# Altium schematic symbol library relay.SCHLIB: 425 symbols (part 2 of 3) (continued)
## RP51* (continued)
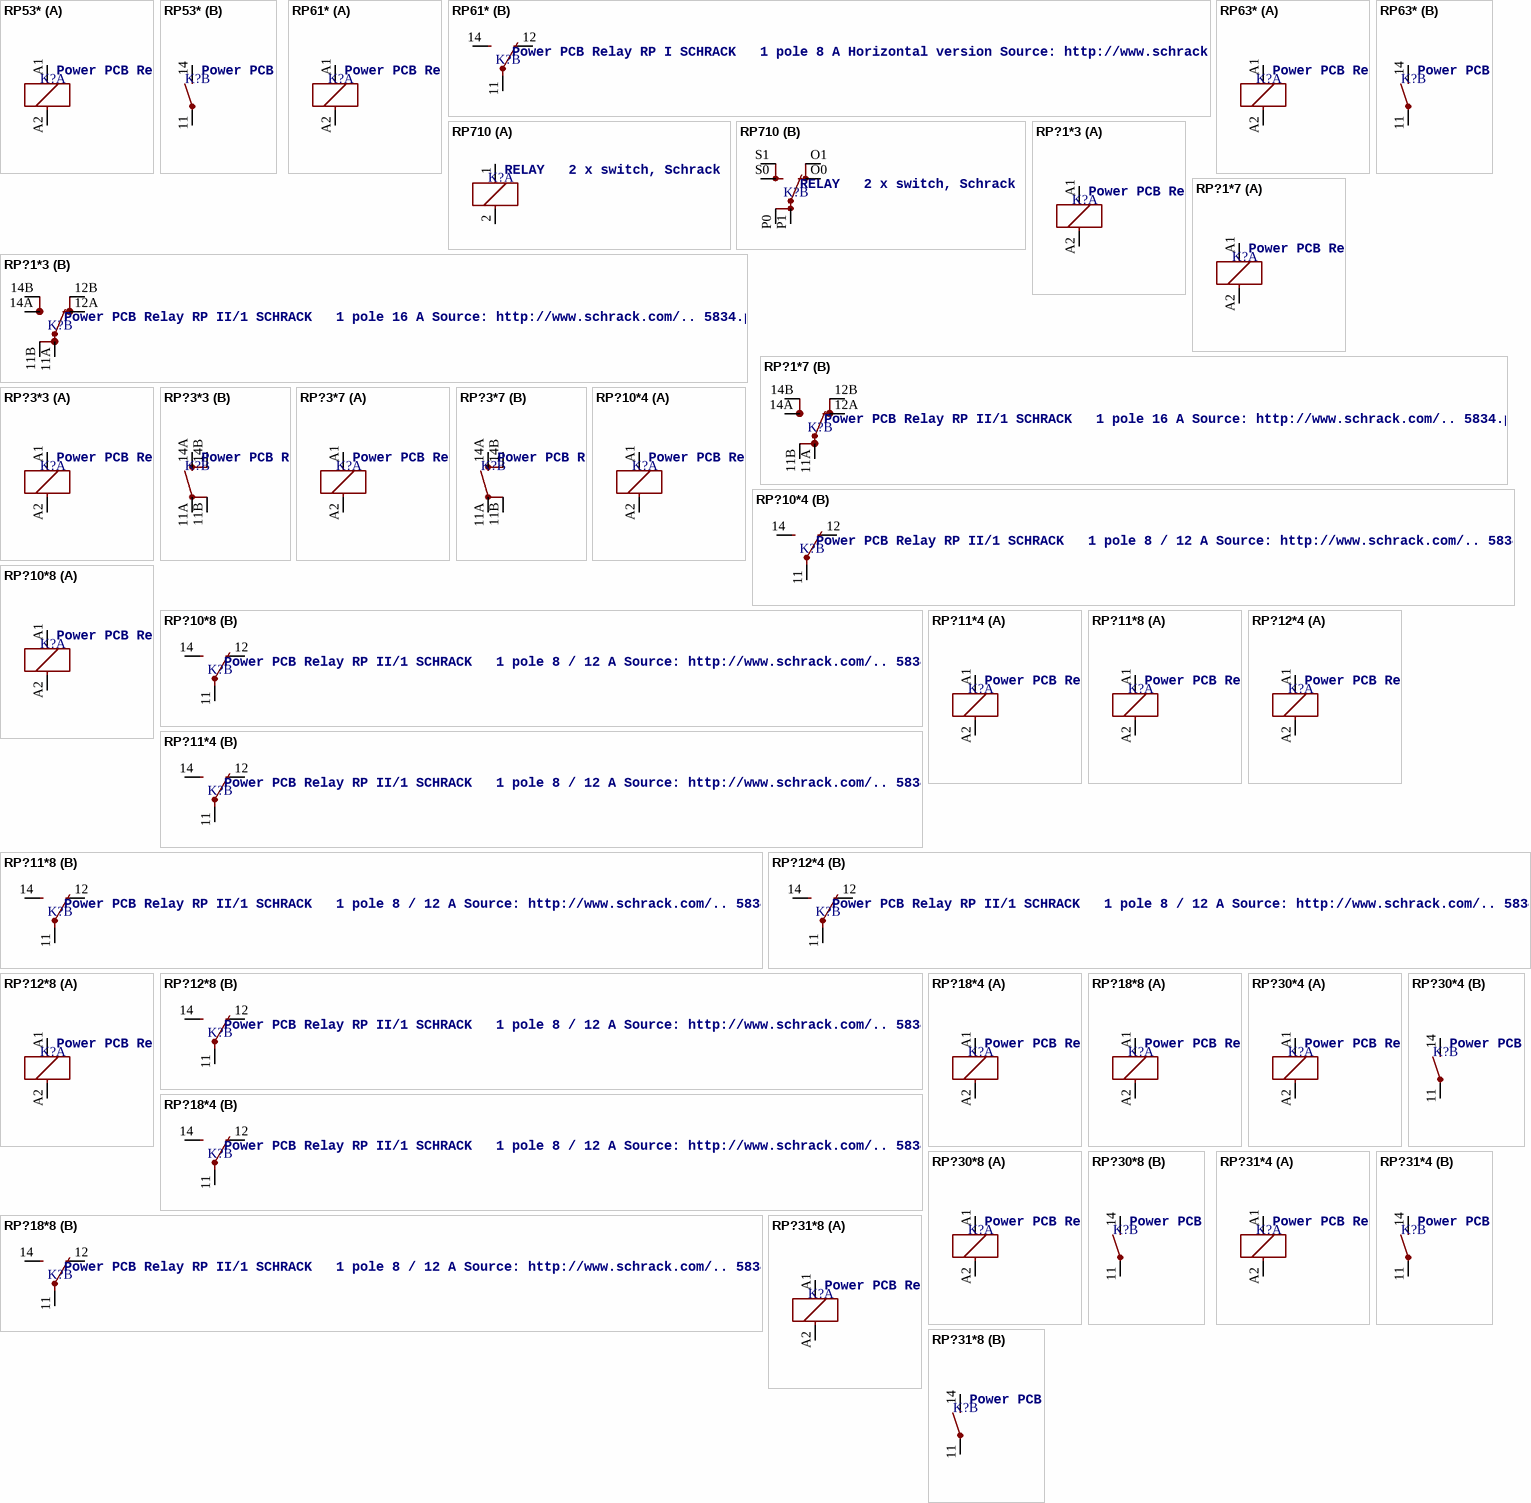
[diagram p23: symbols RP53* to RP?31*8]

## RP53*
designator K?, comment Power PCB Relay RP I SCHRACK   1 pole 8 A Vertical version Source: http://www.schrack.com/.. 5845.pdf
MPN: RP530060-3-0; OC_FARNELL: unknown; OC_NEWARK: unknown; OC_NEWARK: 16C5685
footprint RP53
part A pins: A1 1, A2 2
part B pins: 11 P, 14 S

## RP61*
designator K?, comment Power PCB Relay RP I SCHRACK   1 pole 8 A Horizontal version Source: http://www.schrack.com/.. 5845.pdf
OC_FARNELL: unknown; OC_NEWARK: unknown
footprint RP61
part A pins: A1 1, A2 2
part B pins: 11 P, 12 O, 14 S

## RP63*
designator K?, comment Power PCB Relay RP I SCHRACK   1 pole 8 A Horizontal version Source: http://www.schrack.com/.. 5845.pdf
OC_FARNELL: unknown; OC_NEWARK: unknown
footprint RP63
part A pins: A1 1, A2 2
part B pins: 11 P, 14 S

## RP710
designator K?, comment RELAY   2 x switch, Schrack
MPN: RP710024; MF: TYCO ELECTRONICS; OC_FARNELL: 388312; OC_NEWARK: 17M1785
footprint RP710
part A pins: 1, 2
part B pins: O0 O, O1 O@1, P0 P@1, P1 P, S0 S, S1 S@1

## RP?1*3
designator K?, comment Power PCB Relay RP II/1 SCHRACK   1 pole 16 A Source: http://www.schrack.com/.. 5834.pdf
MPN: RP310005; MPN: RP310006; MPN: RP310012.; MPN: RP310024; MPN: RP310048; MPN: RP310110; MF: TYCO ELECTRONICS; MF: FARNELL; OC_FARNELL: unknown; OC_NEWARK: 48M7769; OC_NEWARK: 08H3568; OC_FARNELL: 388294; OC_NEWARK: 87H7751; OC_FARNELL: 1838950; OC_NEWARK: 17M1783; OC_NEWARK: 08H3569; OC_NEWARK: unknown; OC_NEWARK: 97C5675
footprint RT-C/O16A5
part A pins: A1 1, A2 2
part B pins: 11A PA, 11B PB, 12A OA, 12B OB, 14A SA, 14B SB

## RP?1*7
designator K?, comment Power PCB Relay RP II/1 SCHRACK   1 pole 16 A Source: http://www.schrack.com/.. 5834.pdf
MPN: RP710005; MPN: RP710006; MPN: RP710012; MPN: RP710024; MPN: RP710048; MF: TYCO ELECTRONICS; MF: FARNELL; OC_FARNELL: unknown; OC_NEWARK: 52F964; OC_NEWARK: 08H3633; OC_FARNELL: 388312; OC_NEWARK: 50H2650; OC_FARNELL: 388324; OC_NEWARK: 17M1785; OC_NEWARK: 48M7825; OC_NEWARK: unknown
footprint RT-C/O16A5
part A pins: A1 1, A2 2
part B pins: 11A PA, 11B PB, 12A OA, 12B OB, 14A SA, 14B SB

## RP?3*3
designator K?, comment Power PCB Relay RP II/1 SCHRACK   1 pole 16 A Source: http://www.schrack.com/.. 5834.pdf
MPN: RP330048; OC_FARNELL: 388178; OC_NEWARK: 48M7779
footprint RT-N/O16A5
part A pins: A1 1, A2 2
part B pins: 11A PA, 11B PB, 14A SA, 14B SB

## RP?3*7
designator K?, comment Power PCB Relay RP II/1 SCHRACK   1 pole 16 A Source: http://www.schrack.com/.. 5834.pdf
OC_FARNELL: unknown; OC_NEWARK: unknown
footprint RT-N/O16A5
part A pins: A1 1, A2 2
part B pins: 11A PA, 11B PB, 14A SA, 14B SB

## RP?10*4
designator K?, comment Power PCB Relay RP II/1 SCHRACK   1 pole 8 / 12 A Source: http://www.schrack.com/.. 5834.pdf
OC_FARNELL: unknown; OC_NEWARK: unknown
footprint RT-C/O12A5
part A pins: A1 1, A2 2
part B pins: 11 P, 12 O, 14 S

## RP?10*8
designator K?, comment Power PCB Relay RP II/1 SCHRACK   1 pole 8 / 12 A Source: http://www.schrack.com/.. 5834.pdf
MPN: RP810012; MPN: 9-1393231-2; MPN: RP810048; MF: TYCO ELECTRONICS; OC_FARNELL: unknown; OC_NEWARK: unknown; OC_NEWARK: 48M7834; OC_NEWARK: 16H8837; OC_NEWARK: 08H3642
footprint RT-C/O12A5
part A pins: A1 1, A2 2
part B pins: 11 P, 12 O, 14 S

## RP?11*4
designator K?, comment Power PCB Relay RP II/1 SCHRACK   1 pole 8 / 12 A Source: http://www.schrack.com/.. 5834.pdf
MPN: RP411012; MPN: RP411024; MPN: RP411110; OC_FARNELL: unknown; OC_NEWARK: unknown; OC_NEWARK: 48M7784; OC_NEWARK: 48M7785; OC_NEWARK: 48M7786
footprint RT-C/O12A5
part A pins: A1 1, A2 2
part B pins: 11 P, 12 O, 14 S

## RP?11*8
designator K?, comment Power PCB Relay RP II/1 SCHRACK   1 pole 8 / 12 A Source: http://www.schrack.com/.. 5834.pdf
MPN: RP811024; OC_FARNELL: unknown; OC_NEWARK: unknown; OC_NEWARK: 48M7836
footprint RT-C/O12A5
part A pins: A1 1, A2 2
part B pins: 11 P, 12 O, 14 S

## RP?12*4
designator K?, comment Power PCB Relay RP II/1 SCHRACK   1 pole 8 / 12 A Source: http://www.schrack.com/.. 5834.pdf
MPN: 1393231-8; MPN: RP412012; MPN: RP412024; MPN: RP412110; MF: TYCO ELECTRONICS; OC_FARNELL: unknown; OC_NEWARK: 11H3247; OC_NEWARK: unknown; OC_NEWARK: 08H3590; OC_NEWARK: 48M7788; OC_NEWARK: 48M7789
footprint RT-C/O12A3.5
part A pins: A1 1, A2 2
part B pins: 11 P, 12 O, 14 S

## RP?12*8
designator K?, comment Power PCB Relay RP II/1 SCHRACK   1 pole 8 / 12 A Source: http://www.schrack.com/.. 5834.pdf
MPN: RP812024; MF: TYCO ELECTRONICS; OC_FARNELL: unknown; OC_NEWARK: unknown; OC_NEWARK: 08H3648
footprint RT-C/O12A3.5
part A pins: A1 1, A2 2
part B pins: 11 P, 12 O, 14 S

## RP?18*4
designator K?, comment Power PCB Relay RP II/1 SCHRACK   1 pole 8 / 12 A Source: http://www.schrack.com/.. 5834.pdf
MPN: RP418006; MPN: RP418012.; MPN: RP418024; MPN: RP418048; MPN: RP418110; MF: TYCO ELECTRONICS; OC_FARNELL: unknown; OC_NEWARK: unknown; OC_NEWARK: 48M7790; OC_FARNELL: 388191; OC_NEWARK: 14J7708; OC_FARNELL: 388221; OC_NEWARK: 17M1784; OC_NEWARK: 48M7792; OC_NEWARK: 48M7793
footprint RT-C/O12A3.5
part A pins: A1 1, A2 2
part B pins: 11 P, 12 O, 14 S

## RP?18*8
designator K?, comment Power PCB Relay RP II/1 SCHRACK   1 pole 8 / 12 A Source: http://www.schrack.com/.. 5834.pdf
MPN: RP818005; MPN: RP818006; MPN: RP818012; MPN: RP818024; MF: TYCO ELECTRONICS; OC_FARNELL: unknown; OC_NEWARK: 48M7838; OC_NEWARK: 08H3653; OC_FARNELL: 388270; OC_NEWARK: 52F974; OC_FARNELL: 388282; OC_NEWARK: 20C8802; OC_NEWARK: unknown
footprint RT-C/O12A3.5
part A pins: A1 1, A2 2
part B pins: 11 P, 12 O, 14 S

## RP?30*4
designator K?, comment Power PCB Relay RP II/1 SCHRACK   1 pole 8 / 12 A Source: http://www.schrack.com/.. 5834.pdf
OC_FARNELL: unknown; OC_NEWARK: unknown
footprint RT-N/O12A5
part A pins: A1 1, A2 2
part B pins: 11 P, 14 S

## RP?30*8
designator K?, comment Power PCB Relay RP II/1 SCHRACK   1 pole 8 / 12 A Source: http://www.schrack.com/.. 5834.pdf
OC_FARNELL: unknown; OC_NEWARK: unknown
footprint RT-N/O12A5
part A pins: A1 1, A2 2
part B pins: 11 P, 14 S

## RP?31*4
designator K?, comment Power PCB Relay RP II/1 SCHRACK   1 pole 8 / 12 A Source: http://www.schrack.com/.. 5834.pdf
MPN: 4-1393231-5; MF: TYCO ELECTRONICS; OC_FARNELL: unknown; OC_NEWARK: unknown; OC_NEWARK: 13H3096
footprint RT-N/O12A5
part A pins: A1 1, A2 2
part B pins: 11 P, 14 S

## RP?31*8
designator K?, comment Power PCB Relay RP II/1 SCHRACK   1 pole 8 / 12 A Source: http://www.schrack.com/.. 5834.pdf
OC_FARNELL: unknown; OC_NEWARK: unknown
footprint RT-N/O12A5
part A pins: A1 1, A2 2
part B pins: 11 P, 14 S

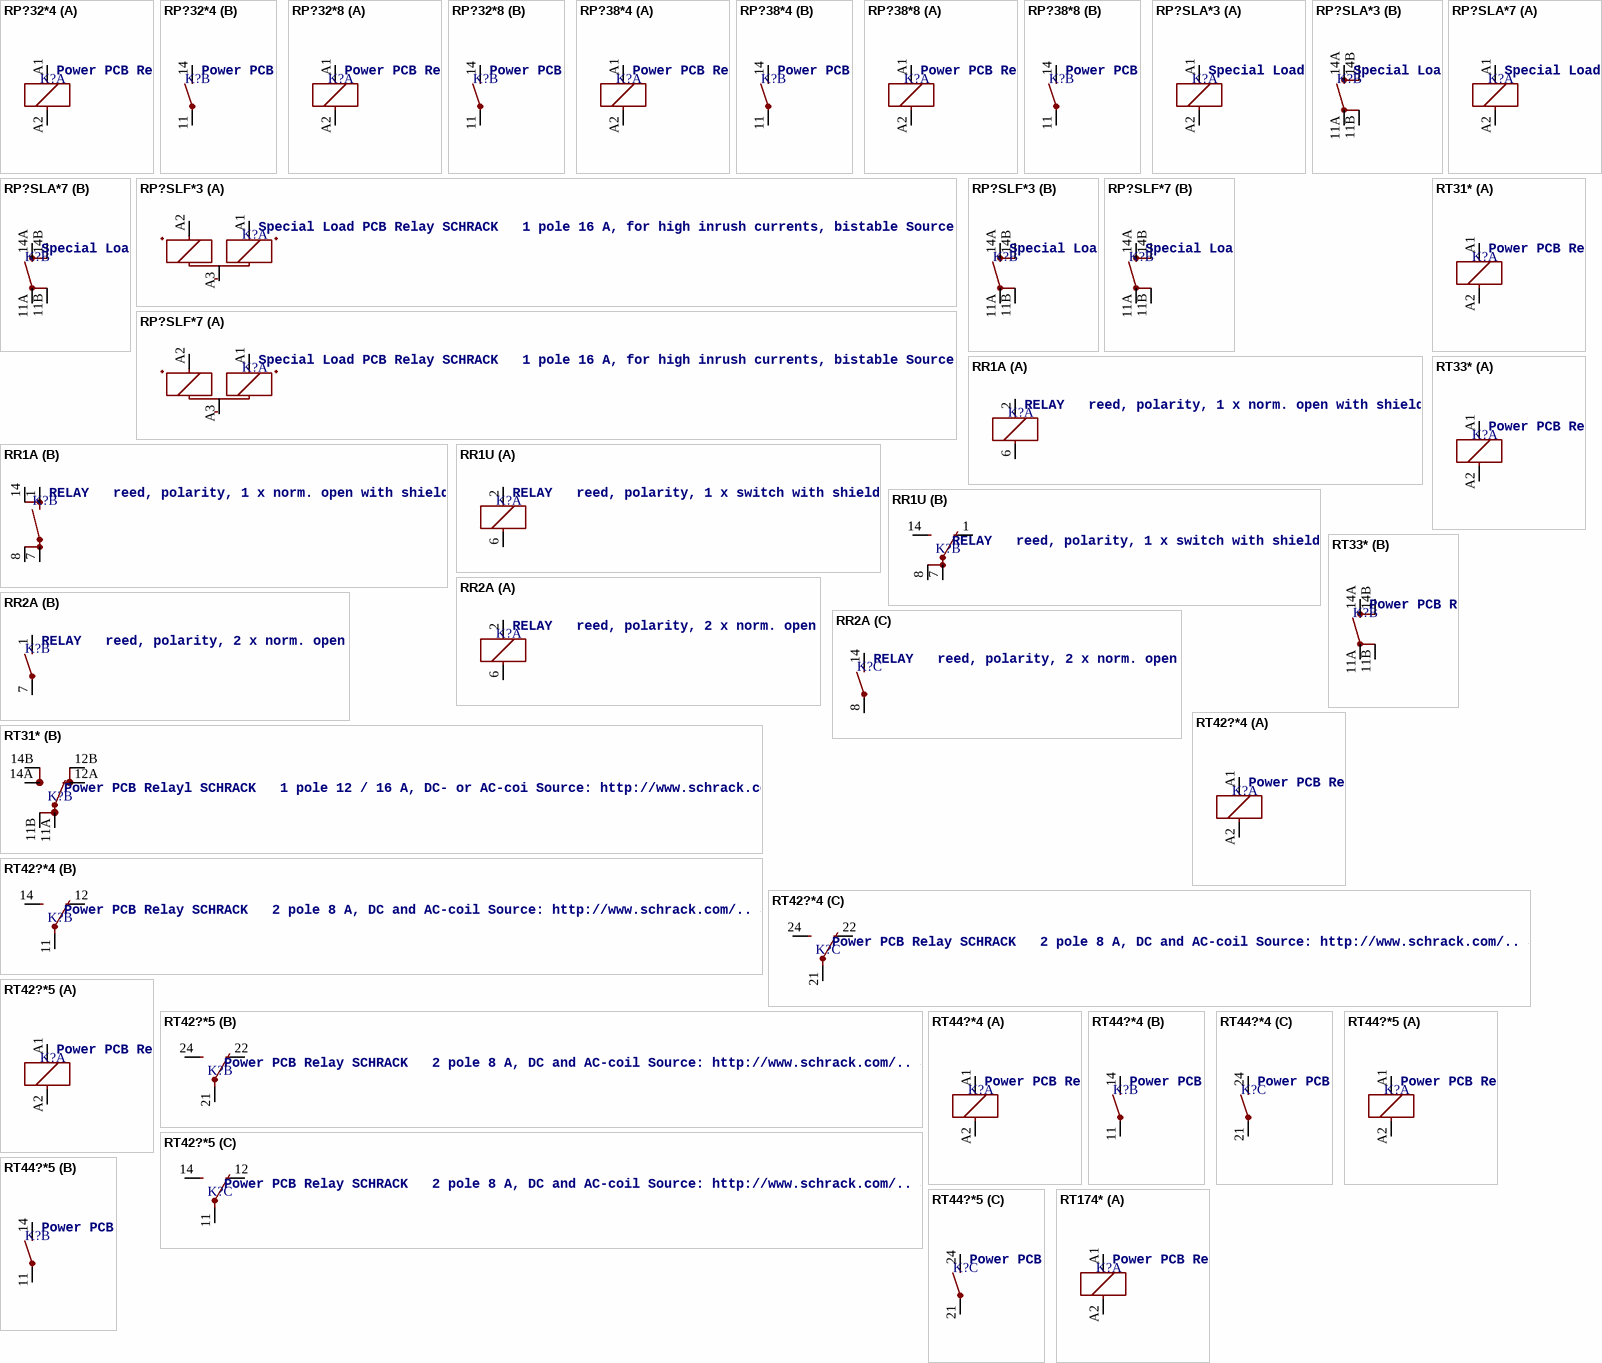
[diagram p24: symbols RP?32*4 to RT174*]

## RP?32*4
designator K?, comment Power PCB Relay RP II/1 SCHRACK   1 pole 8 / 12 A Source: http://www.schrack.com/.. 5834.pdf
MPN: RP432024; MF: TYCO ELECTRONICS; OC_FARNELL: unknown; OC_NEWARK: unknown; OC_NEWARK: 08H3615
footprint RT-N/O12A3.5
part A pins: A1 1, A2 2
part B pins: 11 P, 14 S

## RP?32*8
designator K?, comment Power PCB Relay RP II/1 SCHRACK   1 pole 8 / 12 A Source: http://www.schrack.com/.. 5834.pdf
MPN: 2-1393232-4; MF: TYCO ELECTRONICS; OC_FARNELL: unknown; OC_NEWARK: unknown; OC_NEWARK: 12H2332
footprint RT-N/O12A3.5
part A pins: A1 1, A2 2
part B pins: 11 P, 14 S

## RP?38*4
designator K?, comment Power PCB Relay RP II/1 SCHRACK   1 pole 8 / 12 A Source: http://www.schrack.com/.. 5834.pdf
MPN: 9-1393232-3; MPN: RP438024; MF: TYCO ELECTRONICS; OC_FARNELL: unknown; OC_NEWARK: unknown; OC_NEWARK: 16H8839; OC_NEWARK: 08H3617
footprint RT-N/O12A3.5
part A pins: A1 1, A2 2
part B pins: 11 P, 14 S

## RP?38*8
designator K?, comment Power PCB Relay RP II/1 SCHRACK   1 pole 8 / 12 A Source: http://www.schrack.com/.. 5834.pdf
MPN: RP838006; MPN: RP838012; MPN: RP838024; MF: TYCO ELECTRONICS; OC_FARNELL: unknown; OC_NEWARK: unknown; OC_NEWARK: 52F982; OC_NEWARK: 48M7858; OC_NEWARK: 52F984
footprint RT-N/O12A3.5
part A pins: A1 1, A2 2
part B pins: 11 P, 14 S

## RP?SLA*3
designator K?, comment Special Load PCB Relay SCHRACK   1 pole 16 A, for high inrush currents, monostable Source: http://www.schrack.com/.. 5837.pdf
MPN: RP3SLA05; MPN: RP3SLA12; MPN: RP3SLA24; MF: TYCO ELECTRONICS; OC_FARNELL: unknown; OC_NEWARK: 08H3553; OC_NEWARK: 08H3554; OC_NEWARK: 08H3555
footprint RP-SLA
part A pins: A1 1, A2 2
part B pins: 11A PA, 11B PB, 14A SA, 14B SB

## RP?SLA*7
designator K?, comment Special Load PCB Relay SCHRACK   1 pole 16 A, for high inrush currents, monostable Source: http://www.schrack.com/.. 5837.pdf
MPN: 6-1393231-4; MF: TYCO ELECTRONICS; OC_FARNELL: unknown; OC_NEWARK: unknown; OC_NEWARK: 16H0754
footprint RP-SLA
part A pins: A1 1, A2 2
part B pins: 11A PA, 11B PB, 14A SA, 14B SB

## RP?SLF*3
designator K?, comment Special Load PCB Relay SCHRACK   1 pole 16 A, for high inrush currents, bistable Source: http://www.schrack.com/.. 5837.pdf
MPN: RP3SLF12; MPN: RP3SLF24; MF: TYCO ELECTRONICS; OC_FARNELL: unknown; OC_NEWARK: 16R6258; OC_NEWARK: 08H3556
footprint RP-SLF
part A pins: A1 R+, A2 S+, A3 -
part B pins: 11A PA, 11B PB, 14A SA, 14B SB

## RP?SLF*7
designator K?, comment Special Load PCB Relay SCHRACK   1 pole 16 A, for high inrush currents, bistable Source: http://www.schrack.com/.. 5837.pdf
OC_FARNELL: unknown; OC_NEWARK: unknown
footprint RP-SLF
part A pins: A1 R+, A2 S+, A3 -
part B pins: 11A PA, 11B PB, 14A SA, 14B SB

## RR1A
designator K?, comment RELAY   reed, polarity, 1 x norm. open with shield
OC_FARNELL: unknown; OC_NEWARK: unknown
footprint RR1A
part A pins: 2 1, 6 2
part B pins: 1 S, 7 P, 8 P@1, 14 S@1

## RR1U
designator K?, comment RELAY   reed, polarity, 1 x switch with shield
OC_FARNELL: unknown; OC_NEWARK: unknown
footprint RR1U
part A pins: 2 1, 6 2
part B pins: 1 O, 7 P, 8 P@1, 14 S

## RR2A
designator K?, comment RELAY   reed, polarity, 2 x norm. open
OC_FARNELL: unknown; OC_NEWARK: unknown
footprint RR2A
part A pins: 2 1, 6 2
part B pins: 1 S, 7 P
part C pins: 8 P, 14 S

## RT31*
designator K?, comment Power PCB Relayl SCHRACK   1 pole 12 / 16 A, DC- or AC-coi Source: http://www.schrack.com/.. 5819.pdf
MPN: RT314005; MPN: RT314012; MPN: RT314024; MPN: RT314048; MPN: RT314060; MPN: RT314110; MPN: RT314524; MPN: RT314615; MPN: RT314730; MF: TYCO ELECTRONICS; OC_FARNELL: 1629043; OC_NEWARK: 03P2418; OC_FARNELL: unknown; OC_NEWARK: unknown; OC_FARNELL: 1629044; OC_NEWARK: 03P2419; OC_FARNELL: 1629045; OC_NEWARK: 36K2037; OC_FARNELL: 1629046; OC_NEWARK: 03P2421; OC_NEWARK: 16R6367; OC_NEWARK: 48M7956; OC_FARNELL: 1629047; OC_NEWARK: 03P2422; OC_FARNELL: 1629048; OC_NEWARK: 08H3745; OC_FARNELL: 1629051; OC_NEWARK: 03P2424
footprint RT-C/O16A5
part A pins: A1 1, A2 2
part B pins: 11A PA, 11B PB, 12A OA, 12B OB, 14A SA, 14B SB

## RT33*
designator K?, comment Power PCB Relay Inrush  SCHRACK   1 pole 16 A, for inrush peak currents up to 80 A Source: http://www.schrack.com/.. 5825.pdf
MPN: RT33K012; MPN: RT33K024; MPN: RT33K048; MPN: RT33L012; MPN: RT33L024; MPN: RT33L048; OC_FARNELL: unknown; OC_NEWARK: 48M7964; OC_NEWARK: 48M7965; OC_NEWARK: 16R6370; OC_NEWARK: unknown; OC_FARNELL: 1770614; OC_NEWARK: 74R4452; OC_FARNELL: 1770616; OC_NEWARK: 74R4453; OC_NEWARK: 16R6377
footprint RT-N/O16A5
part A pins: A1 1, A2 2
part B pins: 11A PA, 11B PB, 14A SA, 14B SB

## RT42?*4
designator K?, comment Power PCB Relay SCHRACK   2 pole 8 A, DC and AC-coil Source: http://www.schrack.com/.. 5842.pdf
MPN: RT424005; MPN: RT424006; MPN: RT424012; MPN: RT424024; MPN: RT424048; MPN: RT424110; MPN: RT424524; MPN: RT424615; MPN: RT424730; MF: TYCO ELECTRONICS; OC_FARNELL: 1629052; OC_NEWARK: 03P2425; OC_FARNELL: unknown; OC_NEWARK: 08H3752; OC_FARNELL: 1629053; OC_NEWARK: 03P2426; OC_FARNELL: 1629054; OC_NEWARK: 16F393; OC_FARNELL: 1629055; OC_NEWARK: 03P2428; OC_NEWARK: unknown; OC_NEWARK: 93B6583; OC_FARNELL: 1629056; OC_NEWARK: 94C4293; OC_FARNELL: 1629057; OC_NEWARK: 48F1292; OC_FARNELL: 1629058; OC_NEWARK: 85C0866
footprint RT2C/O
part A pins: A1 1, A2 2
part B pins: 11 P, 12 O, 14 S
part C pins: 21 P, 22 O, 24 S

## RT42?*5
designator K?, comment Power PCB Relay SCHRACK   2 pole 8 A, DC and AC-coil Source: http://www.schrack.com/.. 5842.pdf
MPN: 8-1393243-0; MPN: 8-1393243-2; MPN: 8-1393243-5; MPN: RT425524; MPN: RT425615; MPN: 9-1393243-3; MF: TYCO ELECTRONICS; OC_FARNELL: unknown; OC_NEWARK: 16H6457; OC_NEWARK: unknown; OC_NEWARK: 16H6458; OC_NEWARK: 16H6459; OC_NEWARK: 48M7992; OC_NEWARK: 48M7993; OC_NEWARK: 83H4419
footprint RT2C/O
part A pins: A1 1, A2 2
part B pins: 21 P, 22 O, 24 S
part C pins: 11 P, 12 O, 14 S

## RT44?*4
designator K?, comment Power PCB Relay SCHRACK   2 pole 8 A, DC and AC-coil Source: http://www.schrack.com/.. 5842.pdf
MPN: 9-1393243-5; MPN: RT444048; MPN: RT444524; MPN: RT444615; MF: TYCO ELECTRONICS; OC_FARNELL: unknown; OC_NEWARK: 16H8852; OC_NEWARK: unknown; OC_NEWARK: 48M7994; OC_NEWARK: 16R6383; OC_NEWARK: 08H3757
footprint RT2N/O
part A pins: A1 1, A2 2
part B pins: 11 P, 14 S
part C pins: 21 P, 24 S

## RT44?*5
designator K?, comment Power PCB Relay SCHRACK   2 pole 8 A, DC and AC-coil Source: http://www.schrack.com/.. 5842.pdf
OC_FARNELL: unknown; OC_NEWARK: unknown
footprint RT2N/O
part A pins: A1 1, A2 2
part B pins: 11 P, 14 S
part C pins: 21 P, 24 S

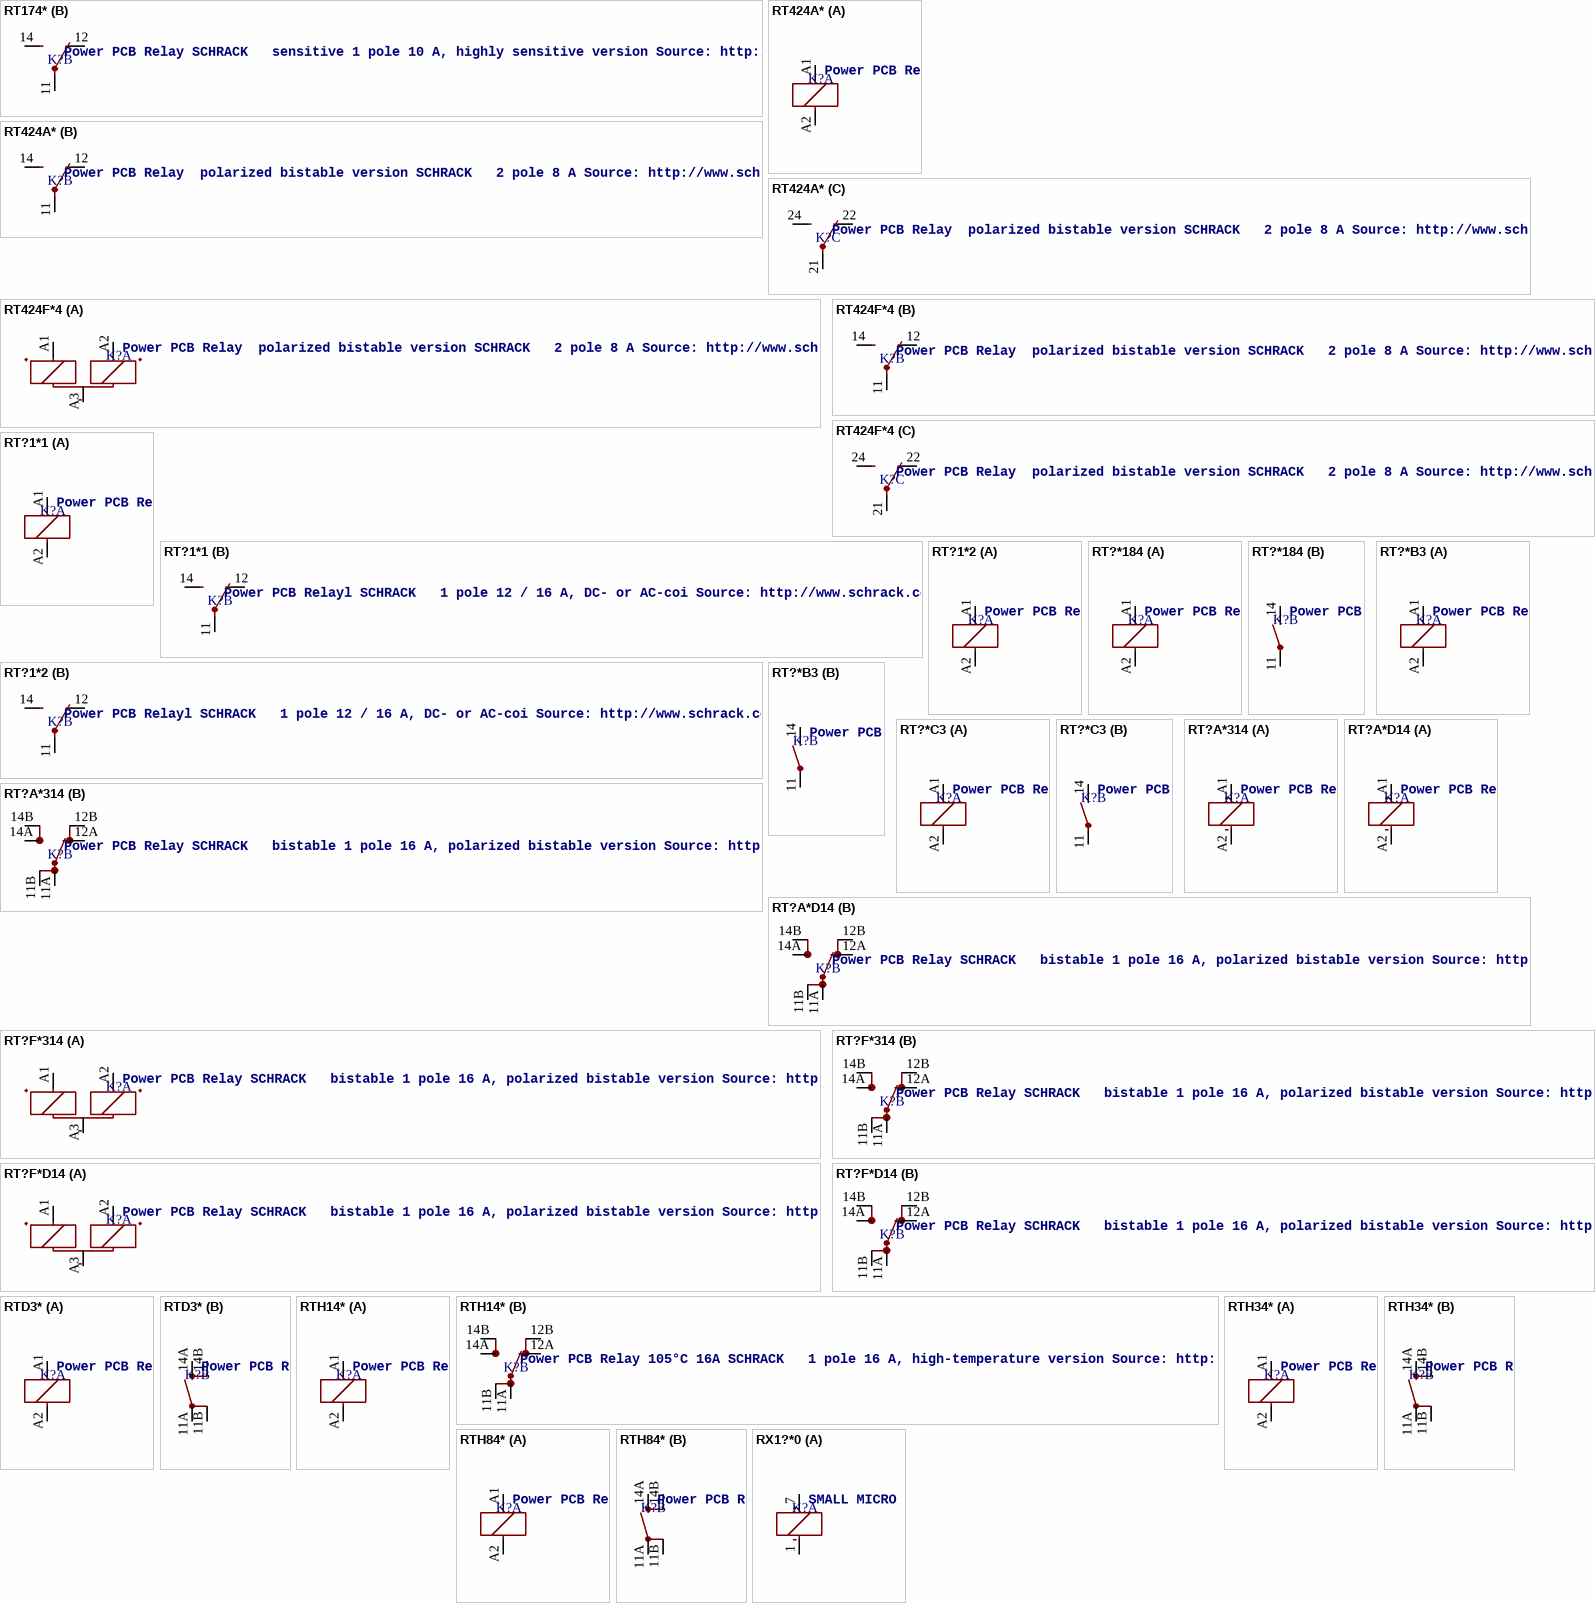
[diagram p25: symbols RT174* to RX1?*0]

## RT174*
designator K?, comment Power PCB Relay SCHRACK   sensitive 1 pole 10 A, highly sensitive version Source: http://www.schrack.com/.. 5822.pdf
MPN: RT174005; MPN: RT174012; MPN: RT174024; MF: TYCO ELECTRONICS; OC_FARNELL: unknown; OC_NEWARK: 48M7931; OC_NEWARK: unknown; OC_NEWARK: 08H3728; OC_NEWARK: 08H3729
footprint RT-C/O12A3.5
part A pins: A1 1, A2 2
part B pins: 11 P, 12 O, 14 S

## RT424A*
designator K?, comment Power PCB Relay  polarized bistable version SCHRACK   2 pole 8 A Source: http://www.schrack.com/.. 5843.pdf
MPN: RT424A05; MPN: RT424A06; MPN: RT424A12; MPN: RT424A24; OC_FARNELL: unknown; OC_NEWARK: 48M7975; OC_NEWARK: 48M7976; OC_NEWARK: 48M7977; OC_NEWARK: 48M7978
footprint RT2C/O
part A pins: A1 1, A2 2
part B pins: 11 P, 12 O, 14 S
part C pins: 21 P, 22 O, 24 S

## RT424F*4
designator K?, comment Power PCB Relay  polarized bistable version SCHRACK   2 pole 8 A Source: http://www.schrack.com/.. 5843.pdf
OC_FARNELL: unknown; OC_NEWARK: unknown
footprint RT424
part A pins: A1 S+, A2 R+, A3 -
part B pins: 11 P, 12 O, 14 S
part C pins: 21 P, 22 O, 24 S

## RT?1*1
designator K?, comment Power PCB Relayl SCHRACK   1 pole 12 / 16 A, DC- or AC-coi Source: http://www.schrack.com/.. 5819.pdf
MPN: RT114005; MPN: RT114006; MPN: RT114012; MPN: RT114024; MPN: RT114048; MPN: RT114060; MPN: RT114110; MPN: RT114524; MPN: RT114615; MPN: RT114730; MF: TYCO ELECTRONICS; OC_FARNELL: 1629035; OC_NEWARK: 03P2411; OC_FARNELL: unknown; OC_NEWARK: 07H3171; OC_FARNELL: 1629036; OC_NEWARK: 03P2412; OC_FARNELL: 1629038; OC_NEWARK: 03P2413; OC_NEWARK: 08H3723; OC_NEWARK: 16R6359; OC_NEWARK: 08H3725; OC_FARNELL: 1629040; OC_NEWARK: 03P2415; OC_FARNELL: 1629041; OC_NEWARK: 03P2416; OC_FARNELL: 1629042; OC_NEWARK: 03P2417
footprint RT-C/O12A3.5
part A pins: A1 1, A2 2
part B pins: 11 P, 12 O, 14 S

## RT?1*2
designator K?, comment Power PCB Relayl SCHRACK   1 pole 12 / 16 A, DC- or AC-coi Source: http://www.schrack.com/.. 5819.pdf
MPN: RT214006; MPN: RT214012; MPN: RT214024; MPN: RT214048; MPN: RT214110; MPN: RT214524; MPN: RT214615; MPN: RT214730; MF: TYCO ELECTRONICS; OC_FARNELL: unknown; OC_NEWARK: unknown; OC_NEWARK: 08H3734; OC_NEWARK: 48M7937; OC_NEWARK: 08H3735; OC_NEWARK: 16R6362; OC_NEWARK: 16R6363; OC_NEWARK: 50H8104; OC_NEWARK: 93B6578; OC_NEWARK: 08H3736
footprint RT-C/O12A5
part A pins: A1 1, A2 2
part B pins: 11 P, 12 O, 14 S

## RT?*184
designator K?, comment Power PCB Relay SCHRACK   1 pole 12 / 16 A, DC- or AC-coil Source: http://www.schrack.com/.. 5819.pdf
MPN: RT184005; MPN: RT184012; MPN: RT184024; MF: TYCO ELECTRONICS; OC_FARNELL: unknown; OC_NEWARK: 08H3730; OC_NEWARK: unknown; OC_NEWARK: 08H3731; OC_NEWARK: 08H3733
footprint RT-N/O12A3.5
part A pins: A1 1, A2 2
part B pins: 11 P, 14 S

## RT?*B3
designator K?, comment Power PCB Relay SCHRACK   1 pole 12 / 16 A, DC- or AC-coil Source: http://www.schrack.com/.. 5819.pdf
MPN: RTB34005F; MPN: RTB34012; MPN: RTB34024F; MPN: RTB34730; MF: TYCO ELECTRONICS; OC_FARNELL: unknown; OC_NEWARK: 08H3696; OC_NEWARK: unknown; OC_FARNELL: 9865071; OC_NEWARK: 48M7873; OC_NEWARK: 35K3224; OC_NEWARK: 48M7874
footprint RT-N/O12A3.5
part A pins: A1 1, A2 2
part B pins: 11 P, 14 S

## RT?*C3
designator K?, comment Power PCB Relay SCHRACK   1 pole 12 / 16 A, DC- or AC-coil Source: http://www.schrack.com/.. 5819.pdf
OC_FARNELL: unknown; OC_NEWARK: unknown
footprint RT-N/O12A5
part A pins: A1 1, A2 2
part B pins: 11 P, 14 S

## RT?A*314
designator K?, comment Power PCB Relay SCHRACK   bistable 1 pole 16 A, polarized bistable version Source: http://www.schrack.com/.. 5821.pdf
MPN: RT314A06; MPN: RT314A12; MPN: RT314A24; MF: TYCO ELECTRONICS; OC_FARNELL: unknown; OC_NEWARK: 48M7945; OC_NEWARK: 08H3738; OC_NEWARK: 08H3739
footprint RT1-BI
part A pins: A1 +, A2 -
part B pins: 11A PA, 11B PB, 12A OA, 12B OB, 14A SA, 14B SB

## RT?A*D14
designator K?, comment Power PCB Relay SCHRACK   bistable 1 pole 16 A, polarized bistable version Source: http://www.schrack.com/.. 5821.pdf
OC_FARNELL: unknown; OC_NEWARK: unknown
footprint RT1-BI
part A pins: A1 +, A2 -
part B pins: 11A PA, 11B PB, 12A OA, 12B OB, 14A SA, 14B SB

## RT?F*314
designator K?, comment Power PCB Relay SCHRACK   bistable 1 pole 16 A, polarized bistable version Source: http://www.schrack.com/.. 5821.pdf
MPN: RT314F05; MPN: RT314F12; MPN: RT314F24; OC_FARNELL: unknown; OC_NEWARK: 48M7949; OC_NEWARK: unknown; OC_NEWARK: 26M2701; OC_FARNELL: 1175084; OC_NEWARK: 31M5918
footprint RT1-BI
part A pins: A1 S+, A2 R+, A3 -
part B pins: 11A PA, 11B PB, 12A OA, 12B OB, 14A SA, 14B SB

## RT?F*D14
designator K?, comment Power PCB Relay SCHRACK   bistable 1 pole 16 A, polarized bistable version Source: http://www.schrack.com/.. 5821.pdf
OC_FARNELL: unknown; OC_NEWARK: unknown
footprint RT1-BI
part A pins: A1 S+, A2 R+, A3 -
part B pins: 11A PA, 11B PB, 12A OA, 12B OB, 14A SA, 14B SB

## RTD3*
designator K?, comment Power PCB Relay SCHRACK   1 pole 12 / 16 A, DC- or AC-coil Source: http://www.schrack.com/.. 5819.pdf
MPN: RTD34005; MPN: RTD34012F; MPN: RTD34024F; MPN: RTD34048; MPN: RTD34615; MPN: RTD34730; MF: TYCO ELECTRONICS; OC_FARNELL: unknown; OC_NEWARK: 93B4654; OC_NEWARK: unknown; OC_NEWARK: 36K3470; OC_FARNELL: 9850961; OC_NEWARK: 34K0187; OC_NEWARK: 08H3709; OC_NEWARK: 48F1293; OC_NEWARK: 85C1167
footprint RT-N/O16A5
part A pins: A1 1, A2 2
part B pins: 11A PA, 11B PB, 14A SA, 14B SB

## RTH14*
designator K?, comment Power PCB Relay 105°C 16A SCHRACK   1 pole 16 A, high-temperature version Source: http://www.schrack.com/.. 5831.pdf
MPN: RTH14012; MPN: 7-1415025-1; MF: TYCO ELECTRONICS; OC_FARNELL: unknown; OC_NEWARK: unknown; OC_FARNELL: 1629018; OC_NEWARK: 03P2408; OC_NEWARK: 16H4440
footprint RT-C/O16A5
part A pins: A1 1, A2 2
part B pins: 11A PA, 11B PB, 12A OA, 12B OB, 14A SA, 14B SB

## RTH34*
designator K?, comment Power PCB Relay 105°C 16A SCHRACK   1 pole 16 A, high-temperature version Source: http://www.schrack.com/.. 5831.pdf
MPN: RTH34012; MPN: RTH34024; OC_FARNELL: unknown; OC_NEWARK: unknown; OC_NEWARK: 45K1533; OC_NEWARK: 45K1534
footprint RT-N/O16A5
part A pins: A1 1, A2 2
part B pins: 11A PA, 11B PB, 14A SA, 14B SB

## RTH84*
designator K?, comment Power PCB Relay 105°C sensitive SCHRACK   1 pole 10 A, high-temperature version Source: http://www.schrack.com/.. 5828.pdf
OC_FARNELL: unknown; OC_NEWARK: unknown
footprint RT-N/O16A5
part A pins: A1 1, A2 2
part B pins: 11A PA, 11B PB, 14A SA, 14B SB

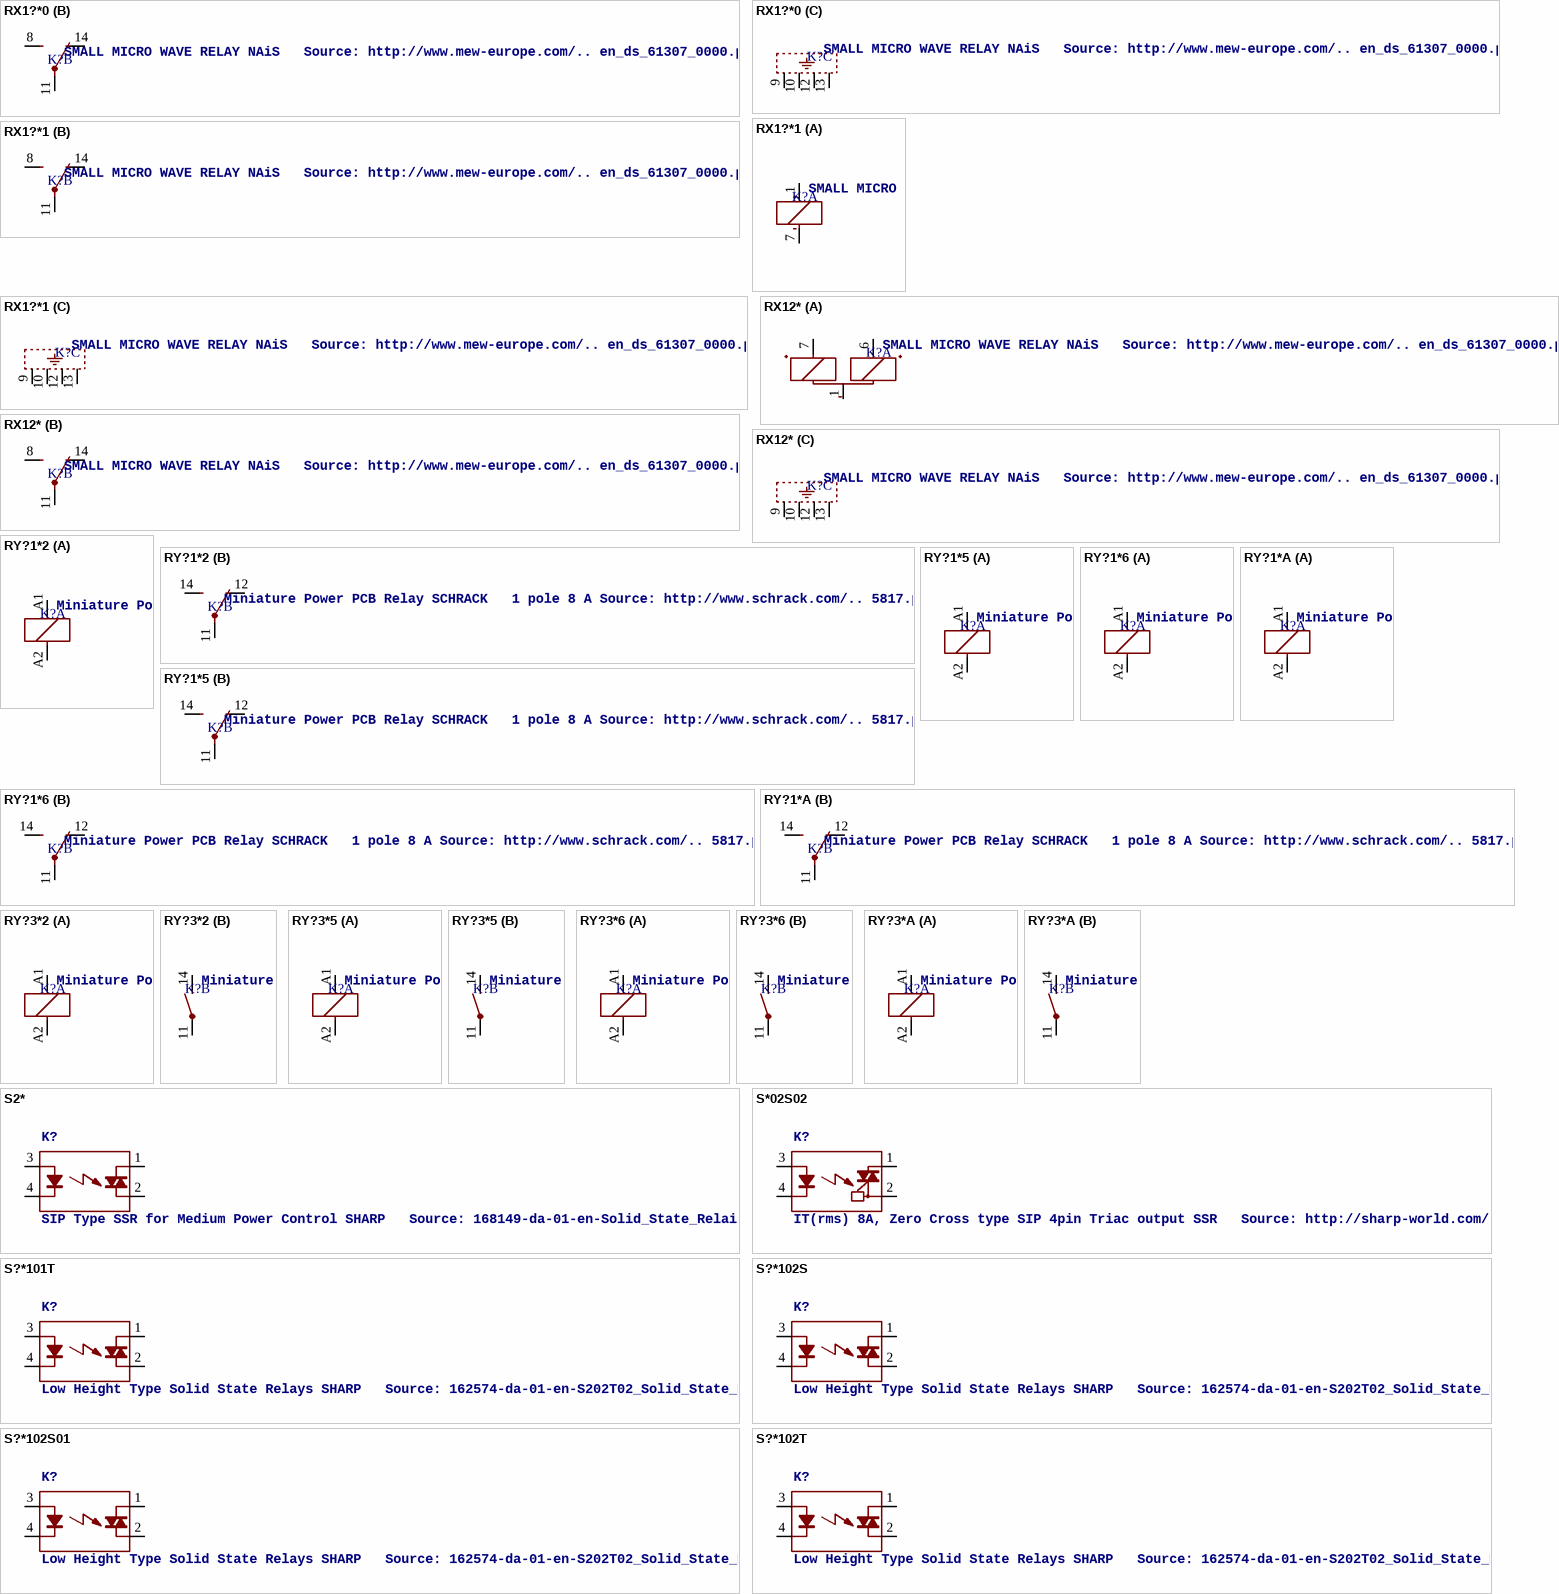
[diagram p26: symbols RX1?*0 to S?*102T]

## RX1?*0
designator K?, comment SMALL MICRO WAVE RELAY NAiS   Source: http://www.mew-europe.com/.. en_ds_61307_0000.pdf
OC_FARNELL: unknown; OC_NEWARK: unknown
footprint RX
part A pins: 1 -, 7 +
part B pins: 8 S, 11 P, 14 O
part C pins: 9 SH@1, 10 SH@2, 12 SH@3, 13 SH@4

## RX1?*1
designator K?, comment SMALL MICRO WAVE RELAY NAiS   Source: http://www.mew-europe.com/.. en_ds_61307_0000.pdf
OC_FARNELL: unknown; OC_NEWARK: unknown
footprint RX
part A pins: 1 +, 7 -
part B pins: 8 S, 11 P, 14 O
part C pins: 9 SH@1, 10 SH@2, 12 SH@3, 13 SH@4

## RX12*
designator K?, comment SMALL MICRO WAVE RELAY NAiS   Source: http://www.mew-europe.com/.. en_ds_61307_0000.pdf
OC_FARNELL: unknown; OC_NEWARK: unknown
footprint RX2
part A pins: 1 -, 6 R+, 7 S+
part B pins: 8 S, 11 P, 14 O
part C pins: 9 SH@1, 10 SH@2, 12 SH@3, 13 SH@4

## RY?1*2
designator K?, comment Miniature Power PCB Relay SCHRACK   1 pole 8 A Source: http://www.schrack.com/.. 5817.pdf
MPN: RY210005; MPN: RY210006; MPN: RY210012; MPN: RY210024; MPN: RY210048; MPN: RY211005; MPN: 4-1393224-3; MPN: RY211012R; MPN: RY211024; MPN: RY211048; MPN: RY212005; MPN: RY212012; MPN: RY212024; MPN: RY213012; MPN: RY213024; MF: TYCO ELECTRONICS; OC_FARNELL: unknown; OC_NEWARK: 08H3762; OC_NEWARK: 08H3763; OC_FARNELL: 1652614; OC_NEWARK: 18C5386; OC_FARNELL: 1652615; OC_NEWARK: 17M1790; OC_NEWARK: 08H3765; OC_FARNELL: 1629032; OC_NEWARK: 16R6445; OC_NEWARK: 13H3089; OC_FARNELL: 1629033; OC_NEWARK: 03P2440; OC_FARNELL: 1629034; OC_NEWARK: 08H3766; OC_NEWARK: 48M8018; OC_NEWARK: 48M8019; OC_NEWARK: unknown; OC_NEWARK: 48M8020; OC_NEWARK: 48M8021; OC_NEWARK: 16R6446; OC_NEWARK: 59P3026
footprint RY-II
part A pins: A1 1, A2 2
part B pins: 11 P, 12 O, 14 S

## RY?1*5
designator K?, comment Miniature Power PCB Relay SCHRACK   1 pole 8 A Source: http://www.schrack.com/.. 5817.pdf
OC_FARNELL: unknown; OC_NEWARK: unknown
footprint RY-II
part A pins: A1 1, A2 2
part B pins: 11 P, 12 O, 14 S

## RY?1*6
designator K?, comment Miniature Power PCB Relay SCHRACK   1 pole 8 A Source: http://www.schrack.com/.. 5817.pdf
MPN: RY610005; MPN: RY610012; MPN: RY610024; MPN: RY610048; MPN: RY611005; MPN: RY611012; MPN: RY611024; MPN: RY611048; MPN: RY612005; MPN: RY612012; MPN: RY612024; MPN: RY612048; MPN: RY613005; MPN: RY613012; MPN: RY613024; MF: TYCO ELECTRONICS; OC_FARNELL: 515863; OC_NEWARK: 48F5539; OC_FARNELL: unknown; OC_NEWARK: unknown; OC_FARNELL: 515875; OC_NEWARK: 52F1002; OC_FARNELL: 515887; OC_NEWARK: 52F1003; OC_NEWARK: 08H3773; OC_FARNELL: 9659706; OC_NEWARK: 97K9204; OC_FARNELL: 9659714; OC_NEWARK: 97K9205; OC_FARNELL: 9659722; OC_NEWARK: 29C5433; OC_NEWARK: 08H3777; OC_NEWARK: 48M8046; OC_NEWARK: 96B4867; OC_FARNELL: 1703736; OC_NEWARK: 89C3213; OC_NEWARK: 73C7516; OC_NEWARK: 16R6452; OC_NEWARK: 29M8966; OC_NEWARK: 48M8052
footprint RY-II
part A pins: A1 1, A2 2
part B pins: 11 P, 12 O, 14 S

## RY?1*A
designator K?, comment Miniature Power PCB Relay SCHRACK   1 pole 8 A Source: http://www.schrack.com/.. 5817.pdf
OC_FARNELL: unknown; OC_NEWARK: unknown
footprint RY-II
part A pins: A1 1, A2 2
part B pins: 11 P, 12 O, 14 S

## RY?3*2
designator K?, comment Miniature Power PCB Relay SCHRACK   1 pole 8 A Source: http://www.schrack.com/.. 5817.pdf
MPN: RY230048; OC_FARNELL: unknown; OC_NEWARK: unknown; OC_NEWARK: 48M8022
footprint RY-II1
part A pins: A1 1, A2 2
part B pins: 11 P, 14 S

## RY?3*5
designator K?, comment Miniature Power PCB Relay SCHRACK   1 pole 8 A Source: http://www.schrack.com/.. 5817.pdf
MPN: RY530005; MPN: RY530006; MPN: RY530012; MPN: RY530024; MPN: RY530048; MPN: RY531005; MPN: RY531012; MPN: RY531024; MPN: RY532012; MPN: RY532024; MPN: RY533012; MPN: RY533024; MPN: RY900016(RY533048); MF: TYCO ELECTRONICS; OC_FARNELL: unknown; OC_NEWARK: 48M8023; OC_NEWARK: 48M8024; OC_NEWARK: 48M8025; OC_NEWARK: 48M8027; OC_NEWARK: 08H3770; OC_NEWARK: 48M8029; OC_NEWARK: unknown; OC_NEWARK: 16R6447; OC_NEWARK: 16R6448; OC_NEWARK: 48M8031; OC_NEWARK: 16R6449; OC_NEWARK: 48M8033; OC_NEWARK: 16R6450; OC_NEWARK: 48M8055
footprint RY-II1
part A pins: A1 1, A2 2
part B pins: 11 P, 14 S

## RY?3*6
designator K?, comment Miniature Power PCB Relay SCHRACK   1 pole 8 A Source: http://www.schrack.com/.. 5817.pdf
OC_FARNELL: unknown; OC_NEWARK: unknown
footprint RY-II1
part A pins: A1 1, A2 2
part B pins: 11 P, 14 S

## RY?3*A
designator K?, comment Miniature Power PCB Relay SCHRACK   1 pole 8 A Source: http://www.schrack.com/.. 5817.pdf
MPN: RYA30005; MPN: RYA30006; MPN: RYA30012; MPN: RYA30024; MPN: RYA31005; MPN: RYA31012; MPN: RYA31024; MPN: RYA31048; MPN: RYA32005; MPN: RYA32012; MF: TYCO ELECTRONICS; OC_FARNELL: unknown; OC_NEWARK: 48M7996; OC_NEWARK: 08H3758; OC_NEWARK: 89M6563; OC_NEWARK: 52F1005; OC_NEWARK: unknown; OC_FARNELL: 9659730; OC_NEWARK: 97K9200; OC_FARNELL: 9659749; OC_NEWARK: 97K9201; OC_FARNELL: 9659757; OC_NEWARK: 97K9202; OC_NEWARK: 16R6440; OC_NEWARK: 08H3760; OC_NEWARK: 16R6441
footprint RY-II1
part A pins: A1 1, A2 2
part B pins: 11 P, 14 S

## S2*
designator K?, comment SIP Type SSR for Medium Power Control SHARP   Source: 168149-da-01-en-Solid_State_Relais_S_202_SE1_SE2.pdf
OC_FARNELL: unknown; OC_NEWARK: unknown
footprint S2XXEX
pins: 1 DS1, 2 DS2, 3 A, 4 K

## S*02S02
designator K?, comment IT(rms) 8A, Zero Cross type SIP 4pin Triac output SSR   Source: http://sharp-world.com/products/device/lineup/data/pdf/datasheet/s102s02_e.pdf
MPN: S202S02F; OC_FARNELL: unknown; OC_NEWARK: unknown; OC_FARNELL: 1618475; OC_NEWARK: 14N9588
footprint S202S02
pins: 1 DS1, 2 DS2, 3 A, 4 K

## S?*101T
designator K?, comment Low Height Type Solid State Relays SHARP   Source: 162574-da-01-en-S202T02_Solid_State_Relais.pdf Source: http://sharp-world.com .. s102s11_e.pdf
OC_FARNELL: unknown; OC_NEWARK: unknown
footprint S102T0X
pins: 1 DS1, 2 DS2, 3 A, 4 K

## S?*102S
designator K?, comment Low Height Type Solid State Relays SHARP   Source: 162574-da-01-en-S202T02_Solid_State_Relais.pdf Source: http://sharp-world.com .. s102s11_e.pdf
OC_FARNELL: unknown; OC_NEWARK: unknown
footprint S2XXEX
pins: 1 DS1, 2 DS2, 3 A, 4 K

## S?*102S01
designator K?, comment Low Height Type Solid State Relays SHARP   Source: 162574-da-01-en-S202T02_Solid_State_Relais.pdf Source: http://sharp-world.com .. s102s11_e.pdf
OC_FARNELL: unknown; OC_NEWARK: unknown
footprint S102S01
pins: 1 DS1, 2 DS2, 3 A, 4 K

## S?*102T
designator K?, comment Low Height Type Solid State Relays SHARP   Source: 162574-da-01-en-S202T02_Solid_State_Relais.pdf Source: http://sharp-world.com .. s102s11_e.pdf
OC_FARNELL: unknown; OC_NEWARK: unknown
footprint S102T0X
pins: 1 DS1, 2 DS2, 3 A, 4 K

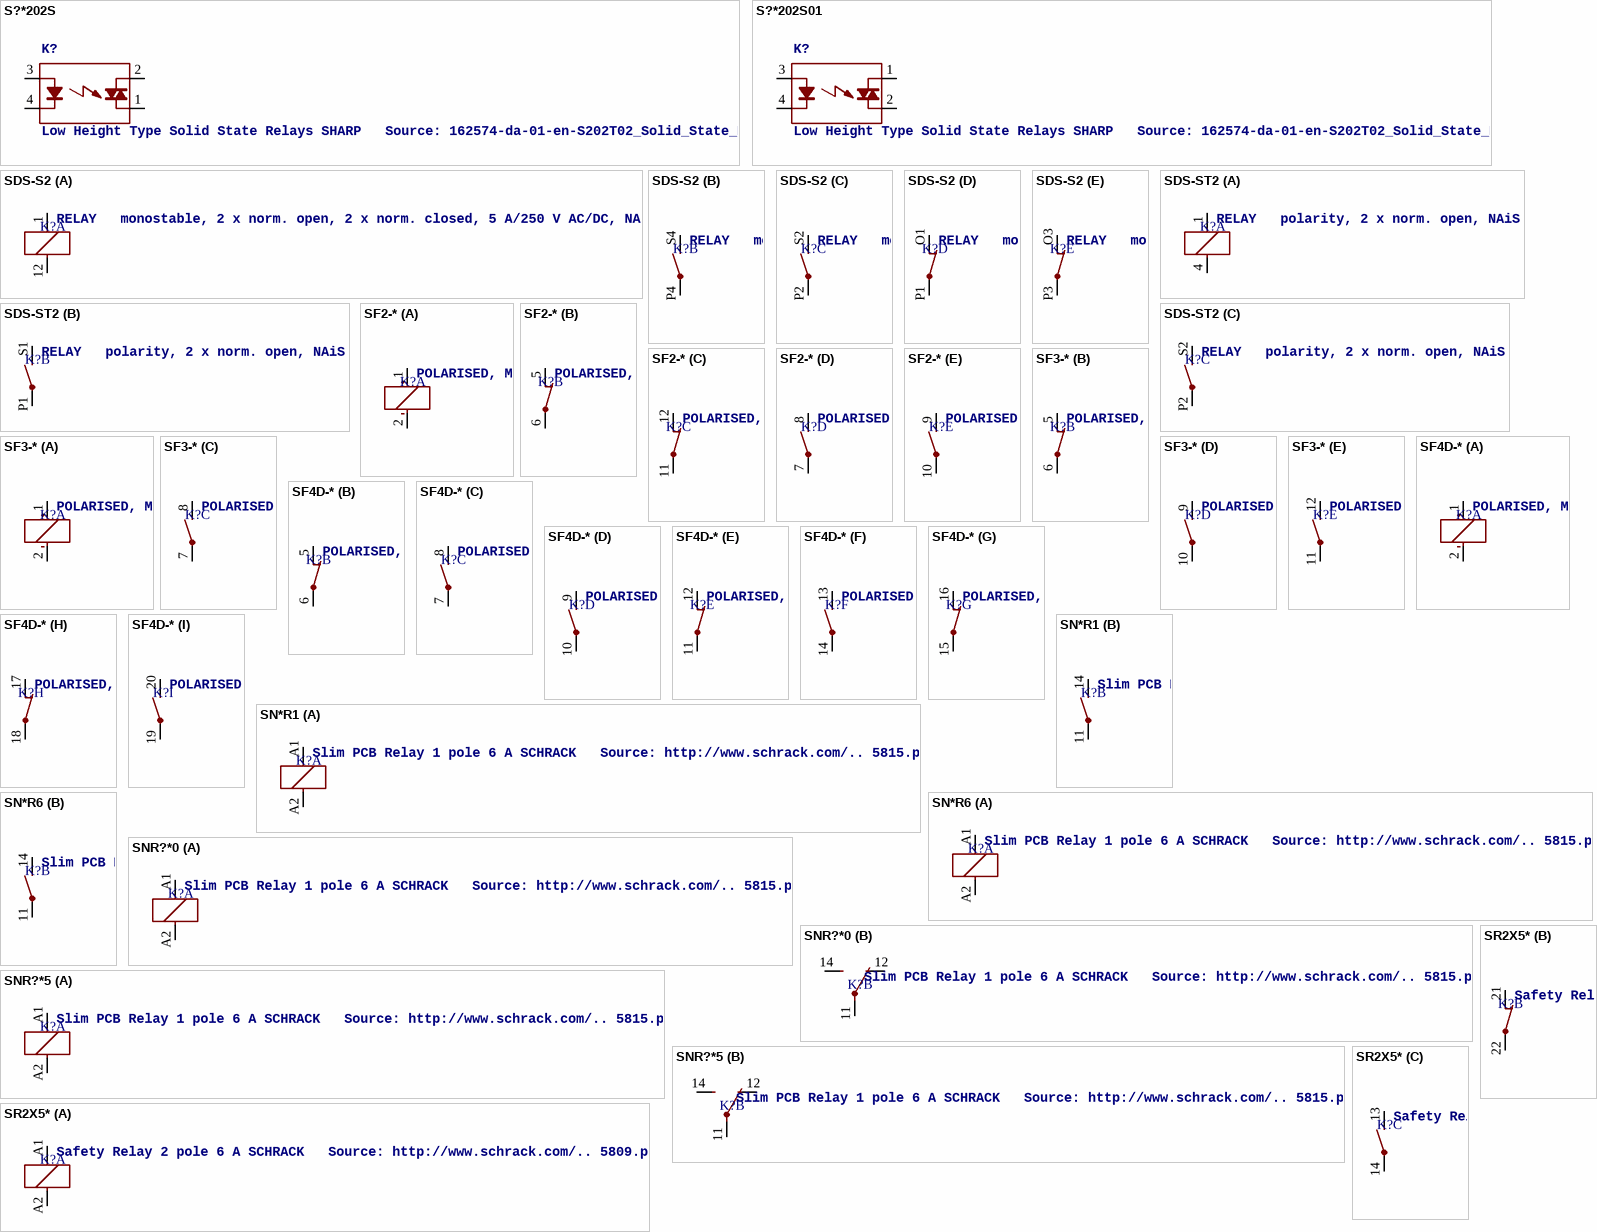
[diagram p27: symbols S?*202S to SR2X5*]

## S?*202S
designator K?, comment Low Height Type Solid State Relays SHARP   Source: 162574-da-01-en-S202T02_Solid_State_Relais.pdf Source: http://sharp-world.com .. s102s11_e.pdf
OC_FARNELL: unknown; OC_NEWARK: unknown
footprint S2XXEX
pins: 1 DS2, 2 DS1, 3 A, 4 K

## S?*202S01
designator K?, comment Low Height Type Solid State Relays SHARP   Source: 162574-da-01-en-S202T02_Solid_State_Relais.pdf Source: http://sharp-world.com .. s102s11_e.pdf
MPN: S202S01F; OC_FARNELL: 1618474; OC_NEWARK: 14N9587
footprint S102S01
pins: 1 DS1, 2 DS2, 3 A, 4 K
